# Altium footprint library hdmi_lvds.PcbLib: 60 footprints (part 3 of 4)
Each footprint in its own frame and in the unit in brackets; x right, y up, seen from the top. Pads: shape width x height; smd on the part's side, far side on the other; paste and mask are expansions set on the pad; w line width, h text height; cw(c..) or ccw(c..) is an arc to the next point about the centre after c.
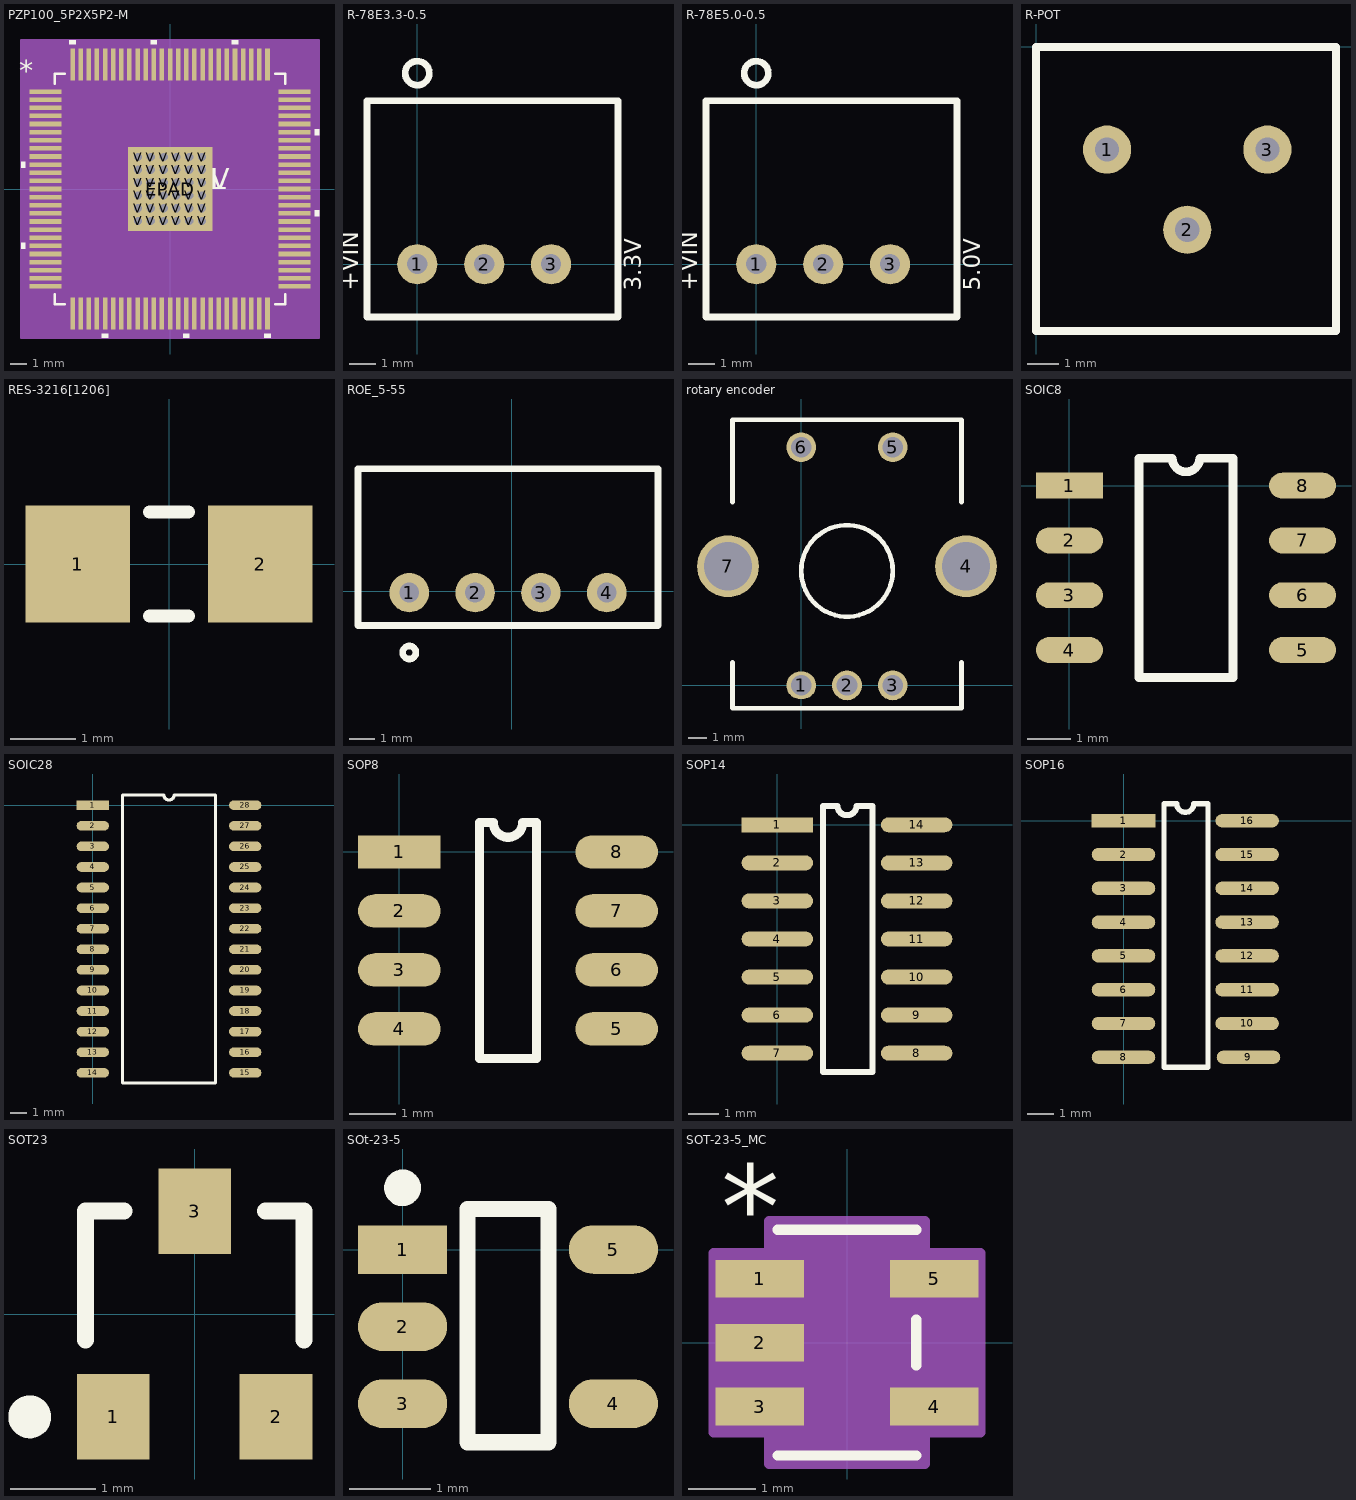
[diagram p2: the footprints below, top view; thin cyan lines are the x and y axes]

## PZP100_5P2X5P2-M [mil]
pads (137):
  rect 78x11 smd: 1(-302,236.22) 2(-302,216.54) 3(-302,196.85) 4(-302,177.17) 5(-302,157.48) 6(-302,137.8) 7(-302,118.11) 8(-302,98.43) 9(-302,78.74) 10(-302,59.06) 11(-302,39.37) 12(-302,19.69) 13(-302,0) 14(-302,-19.68) 15(-302,-39.37) 16(-302,-59.06) 17(-302,-78.74) 18(-302,-98.43) 19(-302,-118.11) 20(-302,-137.8) 21(-302,-157.48) 22(-302,-177.17) 23(-302,-196.85) 24(-302,-216.54) 25(-302,-236.22) 51(302,-236.22) 52(302,-216.54) 53(302,-196.85) 54(302,-177.17) 55(302,-157.48) 56(302,-137.8) 57(302,-118.11) 58(302,-98.43) 59(302,-78.74) 60(302,-59.06) 61(302,-39.37) 62(302,-19.68) 63(302,0) 64(302,19.68) 65(302,39.37) 66(302,59.06) 67(302,78.74) 68(302,98.43) 69(302,118.11) 70(302,137.8) 71(302,157.48) 72(302,177.17) 73(302,196.85) 74(302,216.54) 75(302,236.22)
  rect 11x78 smd: 26(-236.22,-302) 27(-216.54,-302) 28(-196.85,-302) 29(-177.17,-302) 30(-157.48,-302) 31(-137.8,-302) 32(-118.11,-302) 33(-98.43,-302) 34(-78.74,-302) 35(-59.06,-302) 36(-39.37,-302) 37(-19.68,-302) 38(0,-302) 39(19.68,-302) 40(39.37,-302) 41(59.06,-302) 42(78.74,-302) 43(98.43,-302) 44(118.11,-302) 45(137.8,-302) 46(157.48,-302) 47(177.17,-302) 48(196.85,-302) 49(216.54,-302) 50(236.22,-302) 76(236.22,302) 77(216.54,302) 78(196.85,302) 79(177.17,302) 80(157.48,302) 81(137.8,302) 82(118.11,302) 83(98.43,302) 84(78.74,302) 85(59.06,302) 86(39.37,302) 87(19.68,302) 88(0,302) 89(-19.68,302) 90(-39.37,302) 91(-59.06,302) 92(-78.74,302) 93(-98.43,302) 94(-118.11,302) 95(-137.8,302) 96(-157.48,302) 97(-177.17,302) 98(-196.85,302) 99(-216.54,302) 100(-236.22,302)
  rect 204.72x204.72 smd paste-101.86 mask-102: EPAD(0,0)
  round 40 / inner round 60 / far side round 40 hole 20: V(-77.5,-77.5) V(-77.5,-46.5) V(-77.5,-15.5) V(-77.5,15.5) V(-77.5,46.5) V(-77.5,77.5) V(-46.5,-77.5) V(-46.5,-46.5) V(-46.5,-15.5) V(-46.5,15.5) V(-46.5,46.5) V(-46.5,77.5) V(-15.5,-77.5) V(-15.5,-46.5) V(-15.5,-15.5) V(-15.5,15.5) V(-15.5,46.5) V(-15.5,77.5) V(15.5,-77.5) V(15.5,-46.5) V(15.5,-15.5) V(15.5,15.5) V(15.5,46.5) V(15.5,77.5) V(46.5,-77.5) V(46.5,-46.5) V(46.5,-15.5) V(46.5,15.5) V(46.5,46.5) V(46.5,77.5) V(77.5,-77.5) V(77.5,-46.5) V(77.5,-15.5) V(77.5,15.5) V(77.5,46.5) V(77.5,77.5)
Top Overlay:
  region: -228.72,351 -243.72,351 -243.72,361 -228.72,361
  region: -31.87,351 -46.87,351 -46.87,361 -31.87,361
  region: 164.98,351 149.98,351 149.98,361 164.98,361
  region: 351,145.3 361,145.3 361,130.3 351,130.3
  region: 351,-51.56 361,-51.56 361,-66.56 351,-66.56
  region: 243.72,-351 228.72,-351 228.72,-361 243.72,-361
  region: 46.87,-351 31.87,-351 31.87,-361 46.87,-361
  region: -149.98,-351 -164.98,-351 -164.98,-361 -149.98,-361
  region: -351,-130.3 -361,-130.3 -361,-145.3 -351,-145.3
  region: -351,66.56 -361,66.56 -361,51.56 -351,51.56
  lines w6: -279.5,-254.82 -279.5,-279.5 -254.82,-279.5 ; -279.5,254.82 -279.5,279.5 -254.82,279.5 ; 254.82,-279.5 279.5,-279.5 279.5,-254.82 ; 254.82,279.5 279.5,279.5 279.5,254.82
  text "TOL" at 0,0 h50
  text "VAL" at 0,0 h50
  text "DEV" at 0,0 h50
  text "PN" at 0,0 h50
  text "*" at -366,261.06 h50
Top Paste:
  drawing of 49 lines, arcs and shapes, not listed
Top Solder:
  region: 85.37,-104.86 85.37,104.86 104.86,104.86 104.86,-104.86
  region: 69.63,-104.86 69.63,104.86 54.37,104.86 54.37,-104.86
  region: 38.63,-104.86 38.63,104.86 23.37,104.86 23.37,-104.86
  region: 7.63,-104.86 7.63,104.86 -7.63,104.86 -7.63,-104.86
  region: -23.37,-104.86 -23.37,104.86 -38.63,104.86 -38.63,-104.86
  region: -54.37,-104.86 -54.37,104.86 -69.63,104.86 -69.63,-104.86
  region: -104.86,-104.86 -104.86,104.86 -85.37,104.86 -85.37,-104.86
  region: -104.86,-104.86 -104.86,-85.37 104.86,-85.37 104.86,-104.86
  region: -104.86,-69.63 -104.86,-54.37 104.86,-54.37 104.86,-69.63
  region: -104.86,-38.63 -104.86,-23.37 104.86,-23.37 104.86,-38.63
  region: -104.86,-7.63 -104.86,7.63 104.86,7.63 104.86,-7.63
  region: -104.86,23.37 -104.86,38.63 104.86,38.63 104.86,23.37
  region: -104.86,54.37 -104.86,69.63 104.86,69.63 104.86,54.37
  region: -104.86,85.37 -104.86,104.86 104.86,104.86 104.86,85.37
Mechanical 13:
  text "RefDes2" at 0,0 h50
  text "*" at -366,261.06 h50
Mechanical 15:
  region: 361,-361 -361,-361 -361,361 361,361
  lines w6: -361,-361 361,-361 361,361 -361,361 -361,-361
3D body "PZP100_5P2X5P2-M.stp": height 47.1, standoff 0, extent -319,-319 319,319

## R-78E3.3-0.5 [mil] "3.3 V DC/DC Converter"
height 409.45
pads (3):
  round 60 hole 30: 1(0,0) 2(100,0) 3(200,0)
Top Overlay:
  lines w10: 17.49,289.81 ccw(c0,285.43) 18.03,285.43 ; -75,-78.74 -75,244.09 300,244.09 300,-78.74 -75,-78.74
  text "+VIN" at -88.58,-39.37 h25
  text "3.3V" at 334.65,-39.37 h25

## R-78E5.0-0.5 [mil] "5.0 V DC/DC Converter"
height 409.45
pads (3):
  round 60 hole 30: 1(0,0) 2(100,0) 3(200,0)
Top Overlay:
  lines w10: 17.49,289.81 ccw(c0,285.43) 18.03,285.43 ; -75,-78.74 -75,244.09 300,244.09 300,-78.74 -75,-78.74
  text "+VIN" at -88.58,-39.37 h25
  text "5.0V" at 334.65,-39.37 h25

## R-POT [mil]
pads (3):
  round 60 hole 30: 1(88.58,-127.95) 2(188.58,-227.95) 3(288.58,-127.95)
Top Overlay:
  lines w10: 0,-354.33 0,0 374.02,0 374.02,-354.33 0,-354.33

## RES-3216[1206] [mm] "Chip Resistor; Body 3.2 x 1.6 mm (LxW typ)"
height 0.71
pads (2):
  rect 1.6x1.8 smd: 1(-1.4,0) 2(1.4,0)
Top Overlay:
  lines w0.2: -0.3,-0.8 0.3,-0.8 ; -0.3,0.8 0.3,0.8
3D body "RES-1206.STEP": height 1, standoff 0, extent -1.6,-0.787 1.6,0.813

## ROE_5-55 [mil] "isolated DC/DC  converter"
height 440
pads (4):
  round 60 hole 30: 1(-156,-2) 2(-56,-2) 3(44,-2) 4(144,-2)
Top Overlay:
  circle w10: c-156,-93 r10
  lines w10: -234,-52 -234,186 222,186 222,-52 -234,-52

## rotary encoder [mil] "rotary encoder"
height 100
pads (7):
  oval 65x60 hole 45: 1(0,0)
  round 65 hole 45: 2(100,0) 3(200,0) 5(200,520) 6(0,520)
  round 135 hole 105: 4(360,260) 7(-160,260)
Top Overlay:
  circle w10: c100,250 r100
  lines w10: -150,50 -150,-50 350,-50 350,50 ; -150,400 -150,580 350,580 350,400

## sn74lv161_ssop16 [mil]
height 78.74

## SOIC8 [mm]
height 1.753
pads (8):
  rect 1.55x0.6 smd: 1(0,0)
  oval 1.55x0.6 smd: 2(0,-1.27) 3(0,-2.54) 4(0,-3.81) 5(5.4,-3.81) 6(5.4,-2.54) 7(5.4,-1.27) 8(5.4,0)
Top Overlay:
  lines w0.2: 1.61,-4.445 3.79,-4.445 3.79,0.635 3.017,0.635 cw(c2.7,0.635) 2.382,0.635 1.61,0.635 1.61,-4.445

## SOIC28 [mm]
pads (28):
  rect 2x0.6 smd: 1(0,0)
  oval 2x0.6 smd: 2(0,-1.27) 3(0,-2.54) 4(0,-3.81) 5(0,-5.08) 6(0,-6.35) 7(0,-7.62) 8(0,-8.89) 9(0,-10.16) 10(0,-11.43) 11(0,-12.7) 12(0,-13.97) 13(0,-15.24) 14(0,-16.51) 15(9.4,-16.51) 16(9.4,-15.24) 17(9.4,-13.97) 18(9.4,-12.7) 19(9.4,-11.43) 20(9.4,-10.16) 21(9.4,-8.89) 22(9.4,-7.62) 23(9.4,-6.35) 24(9.4,-5.08) 25(9.4,-3.81) 26(9.4,-2.54) 27(9.4,-1.27) 28(9.4,0)
Top Overlay:
  lines w0.2: 1.835,-17.145 1.835,0.635 4.382,0.635 ccw(c4.7,0.635) 5.017,0.635 7.565,0.635 7.565,-17.145 1.835,-17.145

## SOP8 [mm]
pads (8):
  rect 1.78x0.72 smd: 1(0,0)
  oval 1.78x0.72 smd: 2(0,-1.27) 3(0,-2.54) 4(0,-3.81) 5(4.68,-3.81) 6(4.68,-2.54) 7(4.68,-1.27) 8(4.68,0)
Top Overlay:
  lines w0.2: 1.725,-4.445 2.955,-4.445 2.955,0.635 2.658,0.635 cw(c2.34,0.635) 2.023,0.635 1.725,0.635 1.725,-4.445

## SOP14 [mm]
height 1.753
pads (14):
  rect 2.388x0.5 smd: 1(0,0)
  oval 2.388x0.5 smd: 2(0,-1.27) 3(0,-2.54) 4(0,-3.81) 5(0,-5.08) 6(0,-6.35) 7(0,-7.62) 8(4.648,-7.62) 9(4.648,-6.35) 10(4.648,-5.08) 11(4.648,-3.81) 12(4.648,-2.54) 13(4.648,-1.27) 14(4.648,0)
Top Overlay:
  lines w0.2: 1.524,-8.255 1.524,0.635 2.006,0.635 ccw(c2.324,0.635) 2.641,0.635 3.175,0.635 3.175,-8.255 1.524,-8.255

## SOP16 [mm] "SOP16"
height 1.753
pads (16):
  rect 2.388x0.5 smd: 1(0,0)
  oval 2.388x0.5 smd: 2(0,-1.27) 3(0,-2.54) 4(0,-3.81) 5(0,-5.08) 6(0,-6.35) 7(0,-7.62) 8(0,-8.89) 9(4.699,-8.89) 10(4.648,-7.62) 11(4.648,-6.35) 12(4.648,-5.08) 13(4.648,-3.81) 14(4.648,-2.54) 15(4.648,-1.27) 16(4.648,0)
Top Overlay:
  lines w0.2: 1.524,-9.271 1.524,0.635 2.006,0.635 ccw(c2.324,0.635) 2.641,0.635 3.175,0.635 3.175,-9.271 1.524,-9.271

## SOT23 [mm] "SOT-23; 3 Leads; Body 3.0 x 2.5 mm, inc. leads (LxW max)"
height 1.1
pads (3):
  rect 0.85x1 smd: 1(-0.95,-1.2) 2(0.95,-1.2) 3(0,1.2)
Top Overlay:
  circle w0.25: c-1.925,-1.2 r0.125
  lines w0.2: -1.275,-0.3 -1.275,1.2 -0.825,1.2 ; 0.825,1.2 1.275,1.2 1.275,-0.3
3D body "SOT23.STEP": height 1.1, standoff 0, extent -1.549,-1.27 1.451,1.23

## SOt-23-5 [mm] "SOt-23-5"
height 0.254
pads (5):
  rect 1.1x0.6 smd: 1(0,0)
  oval 1.1x0.6 smd: 2(0,-0.95) 3(0,-1.9) 4(2.6,-1.9) 5(2.6,0)
Top Overlay:
  circle w0.254: c0,0.762 r0.1
  lines w0.2: 0.8,-2.375 1.8,-2.375 1.8,0.5 0.8,0.5 0.8,-2.375

## SOT-23-5_MC [mil]
pads (5):
  rect 52x22 smd paste+0 mask+0: 1(-51,37.4) 2(-51,0) 3(-51,-37.4) 4(51,-37.4) 5(51,37.4)
Top Overlay:
  lines w6: -40.5,-66 40.5,-66 ; -40.5,66 40.5,66 ; 40.5,-13.3 40.5,13.3
  text "*" at -73.5,54.4 h50
Mechanical 13:
  lines w0: -12,61 ccw(c0,61) 12,61
  lines w1: -63,-47.4 -63,-27.4 -35.5,-27.4 -35.5,-47.4 -63,-47.4 ; -63,-10 -63,10 -35.5,10 -35.5,-10 -63,-10 ; -63,27.4 -63,47.4 -35.5,47.4 -35.5,27.4 -63,27.4 ; -35.5,-61 35.5,-61 35.5,61 -35.5,61 -35.5,-61 ; 35.5,-47.4 35.5,-27.4 63,-27.4 63,-47.4 35.5,-47.4 ; 35.5,27.4 35.5,47.4 63,47.4 63,27.4 35.5,27.4
Mechanical 15:
  region: 45.5,-71 -45.5,-71 -45.5,-52.4 -78,-52.4 -78,52.4 -45.5,52.4 -45.5,71 45.5,71 45.5,52.4 78,52.4 78,-52.4 45.5,-52.4
  lines w6: -78,-52.4 -45.5,-52.4 -45.5,-71 45.5,-71 45.5,-52.4 78,-52.4 78,52.4 45.5,52.4 45.5,71 -45.5,71 -45.5,52.4 -78,52.4 -78,-52.4
3D body: height 10, standoff 0, extent 0,0 10,10